# Altium footprint library GBA.PcbLib: 115 footprints (part 3 of 8)
Each footprint in its own frame and in the unit in brackets; x right, y up, seen from the top. Pads: shape width x height; smd on the part's side, far side on the other; paste and mask are expansions set on the pad; w line width, h text height; cw(c..) or ccw(c..) is an arc to the next point about the centre after c.
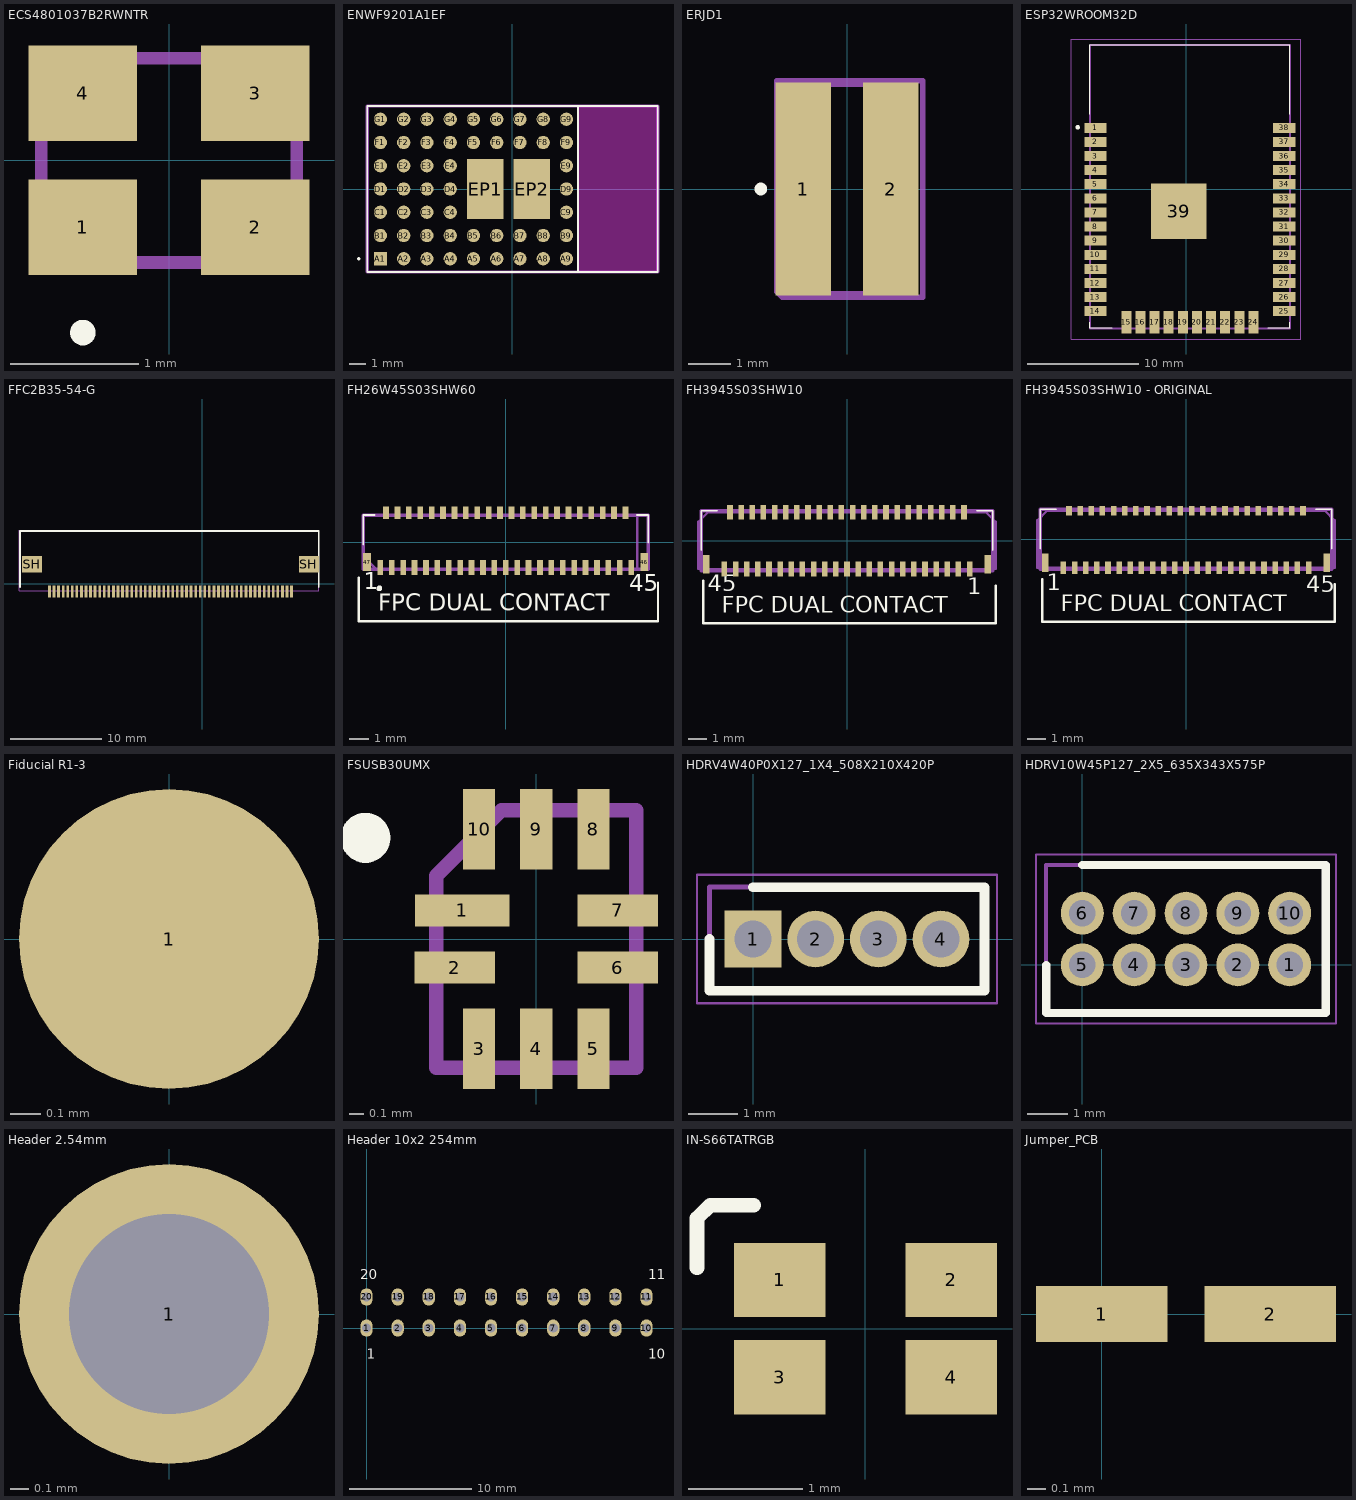
[diagram p2: the footprints below, top view; thin cyan lines are the x and y axes]

## ECS4801037B2RWNTR [mm]
pads (4):
  rect 0.85x0.75 smd: 1(-0.675,-0.525) 2(0.675,-0.525) 3(0.675,0.525) 4(-0.675,0.525)
Top Overlay:
  lines w0.1: -0.675,-1.4 ccw(c-0.675,-1.35) -0.675,-1.3 ccw(c-0.675,-1.35) -0.675,-1.4
Top Designator:
  lines w0.1: -1,-0.524 -0.724,-0.8 1,-0.8 1,0.8 -1,0.8 -1,-0.524
  text ".Designator" at -0.862,-0.474 h1
3D body "ECS-480-10-37B2-RWN-TR.stp": height 0.6, standoff 0, extent -1.025,-0.825 1.025,0.825

## ENWF9201A1EF [mm]
pads (53):
  rect 0.8x0.8 smd: A1(-7.95,-4.2)
  round 0.8 smd: A2(-6.55,-4.2) A3(-5.15,-4.2) A4(-3.75,-4.2) A5(-2.35,-4.2) A6(-0.95,-4.2) A7(0.45,-4.2) A8(1.85,-4.2) A9(3.25,-4.2) B1(-7.95,-2.8) B2(-6.55,-2.8) B3(-5.15,-2.8) B4(-3.75,-2.8) B5(-2.35,-2.8) B6(-0.95,-2.8) B7(0.45,-2.8) B8(1.85,-2.8) B9(3.25,-2.8) C1(-7.95,-1.4) C2(-6.55,-1.4) C3(-5.15,-1.4) C4(-3.75,-1.4) C9(3.25,-1.4) D1(-7.95,0) D2(-6.55,0) D3(-5.15,0) D4(-3.75,0) D9(3.25,0) E1(-7.95,1.4) E2(-6.55,1.4) E3(-5.15,1.4) E4(-3.75,1.4) E9(3.25,1.4) F1(-7.95,2.8) F2(-6.55,2.8) F3(-5.15,2.8) F4(-3.75,2.8) F5(-2.35,2.8) F6(-0.95,2.8) F7(0.45,2.8) F8(1.85,2.8) F9(3.25,2.8) G1(-7.95,4.2) G2(-6.55,4.2) G3(-5.15,4.2) G4(-3.75,4.2) G5(-2.35,4.2) G6(-0.95,4.2) G7(0.45,4.2) G8(1.85,4.2) G9(3.25,4.2)
  rect 2.2x3.6 smd: EP1(-1.65,0) EP2(1.15,0)
Top Overlay:
  lines w0.1: -9.3,-4.2 ccw(c-9.25,-4.2) -9.2,-4.2 ccw(c-9.25,-4.2) -9.3,-4.2 ; -8.75,-5 -8.75,5 8.75,5 8.75,-5 -8.75,-5
  lines w0.127: 3.937,-4.953 3.937,4.953
Keep-Out Layer:
  region: 3.937,-4.953 3.937,4.953 8.763,4.953 8.763,-4.953
Top Designator (Mech29):
  lines w0.2: -8.75,-5 -8.75,5 8.75,5 8.75,-5 -8.75,-5
  text ".Designator" at -4.318,-0.254 h2
3D body "ENW-F9201A1EF.stp": height 2.65, standoff 0, extent -8.75,-5 8.75,5

## ERJD1 [mm]
pads (2):
  rect 1.3x5 smd: 1(-1.025,0) 2(1.025,0)
Top Overlay:
  circle w0.2: c-2.025,0 r0.05
Top Designator:
  lines w0.127: -1.651,-2.413 -1.651,2.54 1.778,2.54 1.778,-2.54 -1.524,-2.54 -1.651,-2.413
  text ".Designator" at 0.32,-2.413 h1
Mechanical 13:
  lines w0.2: -1.25,-2.5 1.25,-2.5 1.25,2.5 -1.25,2.5 -1.25,-2.5
3D body "ERJ-D1DFR010U.stp": height 0.9, standoff 0, extent -1.545,-2.5 1.545,2.5

## ESP32WROOM32D [mm]
pads (39):
  rect 2x0.9 smd: 1(-8.15,5.51) 2(-8.15,4.24) 3(-8.15,2.97) 4(-8.15,1.7) 5(-8.15,0.43) 6(-8.15,-0.84) 7(-8.15,-2.11) 8(-8.15,-3.38) 9(-8.15,-4.65) 10(-8.15,-5.92) 11(-8.15,-7.19) 12(-8.15,-8.46) 13(-8.15,-9.73) 14(-8.15,-11) 25(8.85,-11) 26(8.85,-9.73) 27(8.85,-8.46) 28(8.85,-7.19) 29(8.85,-5.92) 30(8.85,-4.65) 31(8.85,-3.38) 32(8.85,-2.11) 33(8.85,-0.84) 34(8.85,0.43) 35(8.85,1.7) 36(8.85,2.97) 37(8.85,4.24) 38(8.85,5.51)
  rect 0.9x2 smd: 15(-5.365,-12) 16(-4.095,-12) 17(-2.825,-12) 18(-1.555,-12) 19(-0.285,-12) 20(0.985,-12) 21(2.255,-12) 22(3.525,-12) 23(4.795,-12) 24(6.065,-12)
  rrect0% 5x5 smd: 39(-0.65,-1.99)
Top Overlay:
  lines w0.1: -8.65,-12 -8.65,-12.5 -6.65,-12.5 ; -8.65,6.75 -8.65,13 9.35,13 9.35,6.75 ; 7.35,-12.5 9.35,-12.5 9.35,-12
  lines w0.2: -9.75,5.45 cw(c-9.75,5.55) -9.75,5.65 cw(c-9.75,5.55) -9.75,5.45
Mechanical 20:
  lines w0.1: -10.35,-13.5 -10.35,13.5 10.35,13.5 10.35,-13.5 -10.35,-13.5
Top Designator (Mech29):
  lines w0.2: -8.636,-12.546 9.364,-12.546 9.364,12.954 -8.636,12.954 -8.636,-12.546
  text ".Designator" at -2.54,2.413 h0.8
3D body "esp-wroom-32.step": height 3, standoff -0.04, extent -8.671,-12.486 9.399,13.054

## FFC2B35-54-G [mm]
pads (56):
  rect 0.3x1.3 smd: 1(9.75,-0.85) 2(9.25,-0.85) 3(8.75,-0.85) 4(8.25,-0.85) 5(7.75,-0.85) 6(7.25,-0.85) 7(6.75,-0.85) 8(6.25,-0.85) 9(5.75,-0.85) 10(5.25,-0.85) 11(4.75,-0.85) 12(4.25,-0.85) 13(3.75,-0.85) 14(3.25,-0.85) 15(2.75,-0.85) 16(2.25,-0.85) 17(1.75,-0.85) 18(1.25,-0.85) 19(0.75,-0.85) 20(0.25,-0.85) 21(-0.25,-0.85) 22(-0.75,-0.85) 23(-1.25,-0.85) 24(-1.75,-0.85) 25(-2.25,-0.85) 26(-2.75,-0.85) 27(-3.25,-0.85) 28(-3.75,-0.85) 29(-4.25,-0.85) 30(-4.75,-0.85) 31(-5.25,-0.85) 32(-5.75,-0.85) 33(-6.25,-0.85) 34(-6.75,-0.85) 35(-7.25,-0.85) 36(-7.75,-0.85) 37(-8.25,-0.85) 38(-8.75,-0.85) 39(-9.25,-0.85) 40(-9.75,-0.85) 41(-10.25,-0.85) 42(-10.75,-0.85) 43(-11.25,-0.85) 44(-11.75,-0.85) 45(-12.25,-0.85) 46(-12.75,-0.85) 47(-13.25,-0.85) 48(-13.75,-0.85) 49(-14.25,-0.85) 50(-14.75,-0.85) 51(-15.25,-0.85) 52(-15.75,-0.85) 53(-16.25,-0.85) 54(-16.75,-0.85)
  rect 2.2x1.8 smd: SH(-18.65,2.15) SH(11.65,2.15)
Top Overlay:
  lines w0.2: -19.964,-0.35 -19.964,5.804 12.715,5.804 12.715,-0.35
Top Designator:
  lines w0.127: -20.079,-0.776 -20.079,5.855 12.662,5.855 12.7,5.817 12.7,-0.776 -20.079,-0.776
  text ".Designator" at -8.89,1.473 h2.5
3D body "FFC2B35-54-T.stp": height 1.99, standoff -0.01, extent -19.205,-1.165 12.195,5.596

## FH26W45S03SHW60 [mm]
pads (47):
  rect 0.3x0.8 smd: 1(-6.6,-1.325) 3(-6,-1.325) 5(-5.4,-1.325) 7(-4.8,-1.325) 9(-4.2,-1.325) 11(-3.6,-1.325) 13(-3,-1.325) 15(-2.4,-1.325) 17(-1.8,-1.325) 19(-1.2,-1.325) 21(-0.6,-1.325) 23(0,-1.325) 25(0.6,-1.325) 27(1.2,-1.325) 29(1.8,-1.325) 31(2.4,-1.325) 33(3,-1.325) 35(3.6,-1.325) 37(4.2,-1.325) 39(4.8,-1.325) 41(5.4,-1.325) 43(6,-1.325) 45(6.6,-1.325)
  rect 0.3x0.65 smd: 2(-6.3,1.55) 4(-5.7,1.55) 6(-5.1,1.55) 8(-4.5,1.55) 10(-3.9,1.55) 12(-3.3,1.55) 14(-2.7,1.55) 16(-2.1,1.55) 18(-1.5,1.55) 20(-0.9,1.55) 22(-0.3,1.55) 24(0.3,1.55) 26(0.9,1.55) 28(1.5,1.55) 30(2.1,1.55) 32(2.7,1.55) 34(3.3,1.55) 36(3.9,1.55) 38(4.5,1.55) 40(5.1,1.55) 42(5.7,1.55) 44(6.3,1.55)
  rect 0.4x0.95 smd: 46(7.3,-1.05) 47(-7.3,-1.05)
Top Overlay:
  lines w0.1: 7.5,1.425 7.5,-0.025 7.5,1.425 ; 7.5,1.425 6.9,1.425 7.5,1.425 ; -7.5,-0.125 -7.5,1.375 -7.5,-0.125 ; -7.5,1.425 -6.9,1.425 -7.5,1.425
  lines w0.127: -7.734,-1.88 -7.734,-4.166 8.014,-4.166 8.014,-2.134
  lines w0.2: -6.7,-2.425 ccw(c-6.65,-2.425) -6.6,-2.425 ; -6.7,-2.425 cw(c-6.65,-2.425) -6.6,-2.425 ; -6.7,-2.425 ccw(c-6.65,-2.425) -6.6,-2.425
  text "FPC DUAL CONTACT" at -6.718,-3.896 h1.5
  text "1" at -7.48,-2.769 h1.5
  text "45" at 6.49,-2.88 h1.5
Top Designator:
  lines w0.127: -7.468,-0.775 -6.782,-1.46 6.921,-1.46 6.921,1.448 -7.468,1.448 -7.468,-0.775
  text ".Designator" at -3.277,-0.66 h1.75
Mechanical 13:
  lines w0.2: -7.5,-1.425 -7.5,1.425 7.5,1.425 7.5,-1.425 -7.5,-1.425
3D body "WFH-2000120.STEP": height 1, standoff 0, extent -7.487,-1.75 7.513,1.75

## FH3945S03SHW10 [mm]
pads (47):
  rect 0.3x0.8 smd: 1(6.6,-1.533) 2(6.3,1.532) 3(6,-1.533) 4(5.7,1.532) 5(5.4,-1.533) 6(5.1,1.532) 7(4.8,-1.533) 8(4.5,1.532) 9(4.2,-1.533) 10(3.9,1.532) 11(3.6,-1.533) 12(3.3,1.532) 13(3,-1.533) 14(2.7,1.532) 15(2.4,-1.533) 16(2.1,1.532) 17(1.8,-1.533) 18(1.5,1.532) 19(1.2,-1.533) 20(0.9,1.532) 21(0.6,-1.533) 22(0.3,1.532) 23(0,-1.533) 24(-0.3,1.532) 25(-0.6,-1.533) 26(-0.9,1.532) 27(-1.2,-1.533) 28(-1.5,1.532) 29(-1.8,-1.533) 30(-2.1,1.532) 31(-2.4,-1.533) 32(-2.7,1.532) 33(-3,-1.533) 34(-3.3,1.532) 35(-3.6,-1.533) 36(-3.9,1.532) 37(-4.2,-1.533) 38(-4.5,1.532) 39(-4.8,-1.533) 40(-5.1,1.532) 41(-5.4,-1.533) 42(-5.7,1.532) 43(-6,-1.533) 44(-6.3,1.532) 45(-6.6,-1.533)
  rect 0.35x1 smd: 46(-7.575,-1.268) 47(7.575,-1.268)
Top Overlay:
  lines w0.1: -7.85,-0.5 -7.85,1.613 -7,1.613 ; 7,1.613 7.85,1.613 7.85,-0.5
  lines w0.127: -7.747,-2.159 -7.747,-4.445 8.001,-4.445 8.001,-2.413
  text "FPC DUAL CONTACT" at -6.731,-4.175 h1.5
  text "45" at -7.493,-3.032 h1.5
  text "1" at 6.477,-3.175 h1.5
Top Designator:
  lines w0.127: -8.001,-1.524 8.001,-1.524 8.001,1.016 7.493,1.524 -7.493,1.524 -8.001,1.016 -8.001,-1.524
  text ".Designator" at -2.413,-0.193 h1
Mechanical 13:
  lines w0.2: -7.85,-1.613 7.85,-1.613 7.85,1.613 -7.85,1.613 -7.85,-1.613
3D body "FH39-45S-0.3SHW_10_.stp": height 1.99, standoff 0, extent -7.85,-1.838 7.85,1.752

## FH3945S03SHW10 - ORIGINAL [mm]
pads (47):
  rect 0.3x0.67 smd: 1(-6.6,-1.533) 3(-6,-1.533) 5(-5.4,-1.533) 7(-4.8,-1.533) 9(-4.2,-1.533) 11(-3.6,-1.533) 13(-3,-1.533) 15(-2.4,-1.533) 17(-1.8,-1.533) 19(-1.2,-1.533) 21(-0.6,-1.533) 23(0,-1.533) 25(0.6,-1.533) 27(1.2,-1.533) 29(1.8,-1.533) 31(2.4,-1.533) 33(3,-1.533) 35(3.6,-1.533) 37(4.2,-1.533) 39(4.8,-1.533) 41(5.4,-1.533) 43(6,-1.533) 45(6.6,-1.533)
  rect 0.3x0.5 smd: 2(-6.3,1.532) 4(-5.7,1.532) 6(-5.1,1.532) 8(-4.5,1.532) 10(-3.9,1.532) 12(-3.3,1.532) 14(-2.7,1.532) 16(-2.1,1.532) 18(-1.5,1.532) 20(-0.9,1.532) 22(-0.3,1.532) 24(0.3,1.532) 26(0.9,1.532) 28(1.5,1.532) 30(2.1,1.532) 32(2.7,1.532) 34(3.3,1.532) 36(3.9,1.532) 38(4.5,1.532) 40(5.1,1.532) 42(5.7,1.532) 44(6.3,1.532)
  rect 0.35x1 smd: 46(-7.575,-1.268) 47(7.575,-1.268)
Top Overlay:
  lines w0.1: -7.85,-0.5 -7.85,1.613 -7,1.613 ; 7,1.613 7.85,1.613 7.85,-0.5
  lines w0.127: -7.747,-2.159 -7.747,-4.445 8.001,-4.445 8.001,-2.413
  text "FPC DUAL CONTACT" at -6.731,-4.175 h1.5
  text "1" at -7.493,-3.048 h1.5
  text "45" at 6.477,-3.159 h1.5
Top Designator:
  lines w0.127: -8.001,-1.524 8.001,-1.524 8.001,1.016 7.493,1.524 -7.493,1.524 -8.001,1.016 -8.001,-1.524
  text ".Designator" at -2.413,-0.193 h1
Mechanical 13:
  lines w0.2: -7.85,-1.613 7.85,-1.613 7.85,1.613 -7.85,1.613 -7.85,-1.613
3D body "FH39-45S-0.3SHW_10_.stp": height 1.99, standoff 0, extent -7.85,-1.838 7.85,1.752

## Fiducial R1-3 [mm]
pads (1):
  round 1 smd paste-1 mask+1.5: 1(0,0)

## FSUSB30UMX [mm]
pads (10):
  rect 0.663x0.225 smd: 1(-0.518,0.2)
  rect 0.563x0.225 smd: 2(-0.569,-0.2) 6(0.569,-0.2) 7(0.569,0.2)
  rect 0.225x0.563 smd: 3(-0.4,-0.768) 4(0,-0.768) 5(0.4,-0.768) 8(0.4,0.768) 9(0,0.768) 10(-0.4,0.768)
Top Overlay:
  lines w0.25: -1.246,0.708 ccw(c-1.196,0.708) -1.146,0.708 ; -1.246,0.708 cw(c-1.196,0.708) -1.146,0.708 ; -1.246,0.708 ccw(c-1.196,0.708) -1.146,0.708
Top Designator:
  lines w0.1: -0.7,-0.9 0.7,-0.9 0.7,0.9 -0.243,0.9 -0.7,0.443 -0.7,-0.9
  text ".Designator" at 0.512,-0.9 h1
3D body "FSUSB30UMX.stp": height 0.65, standoff 0, extent -0.7,-0.9 0.7,0.9

## HDRV4W40P0X127_1X4_508X210X420P [mm]
pads (4):
  rect 1.15x1.15 hole 0.75: 1(0,0)
  round 1.15 hole 0.75: 2(1.27,0) 3(2.54,0) 4(3.81,0)
Top Overlay:
  lines w0.2: -0.885,0 -0.885,-1.05 4.695,-1.05 4.695,1.05 0,1.05
Mechanical 13:
  lines w0.1: -0.885,-1.05 4.695,-1.05 4.695,1.05 -0.885,1.05 -0.885,-1.05
Mechanical 15:
  lines w0.05: -1.135,-1.3 4.945,-1.3 4.945,1.3 -1.135,1.3 -1.135,-1.3
Top Designator (Mech29):
  text ".Designator" at -0.127,-0.381 h1
3D body "M50-3530442.stp": height 4.2, standoff -2.5, extent -0.635,-1.05 4.445,1.05

## HDRV10W45P127_2X5_635X343X575P [mm]
pads (10):
  round 1.05 hole 0.65: 1(5.08,0) 2(3.81,0) 3(2.54,0) 4(1.27,0) 5(0,0) 6(0,1.27) 7(1.27,1.27) 8(2.54,1.27) 9(3.81,1.27) 10(5.08,1.27)
Top Overlay:
  lines w0.2: -0.885,0 -0.885,-1.18 5.965,-1.18 5.965,2.45 0,2.45
Mechanical 13:
  lines w0.1: -0.885,-1.18 5.965,-1.18 5.965,2.45 -0.885,2.45 -0.885,-1.18
Mechanical 15:
  lines w0.05: -1.135,-1.43 6.215,-1.43 6.215,2.7 -1.135,2.7 -1.135,-1.43
Top Designator (Mech29):
  text ".Designator" at 0.635,0.254 h1
3D body "20021111-00010T1LF.stp": height 5.75, standoff -2.5, extent -0.635,-1.08 5.715,2.35

## Header 2.54mm [mm]
pads (1):
  round 1.65 hole 1.1: 1(0,0)

## Header 10x2 254mm [mm]
pads (20):
  oval 1x1.4 hole 0.75: 1(0,0) 2(2.54,0) 3(5.08,0) 4(7.62,0) 5(10.16,0) 6(12.7,0) 7(15.24,0) 8(17.78,0) 9(20.32,0) 10(22.86,0) 11(22.86,2.54) 12(20.32,2.54) 13(17.78,2.54) 14(15.24,2.54) 15(12.7,2.54) 16(10.16,2.54) 17(7.62,2.54) 18(5.08,2.54) 19(2.54,2.54) 20(0,2.54)
Top Overlay:
  text "1" at 0,-2.5 h0.8
  text "20" at -0.5,4 h0.8
  text "10" at 23,-2.5 h0.8
  text "11" at 23,4 h0.8
Top Designator (Mech29):
  text ".Designator" at 6,1 h0.8
3D body "Header_Fem_1X10.step": height 8.5, standoff -3.2, extent -1.5,-1.27 24.4,1.27
3D body "Header_Fem_1X10.step": height 8.5, standoff -3.2, extent -1.5,1.23 24.4,3.77

## IN-S66TATRGB [mm]
pads (4):
  rect 0.8x0.65 smd: 1(-0.75,0.425) 2(0.75,0.425) 3(-0.75,-0.425) 4(0.75,-0.425)
Top Overlay:
  lines w0.127: -1.473,0.533 -1.473,0.965 -1.359,1.079 -0.978,1.079

## Jumper_PCB [mm]
pads (2):
  rect 0.7x0.3 smd paste-1: 1(0,0) 2(0.9,0)